# Altium footprint library ACTION标准库.pcblib: 504 footprints (part 21 of 32)
Each footprint in its own frame and in the unit in brackets; x right, y up, seen from the top. Pads: shape width x height; smd on the part's side, far side on the other; paste and mask are expansions set on the pad; w line width, h text height; cw(c..) or ccw(c..) is an arc to the next point about the centre after c.
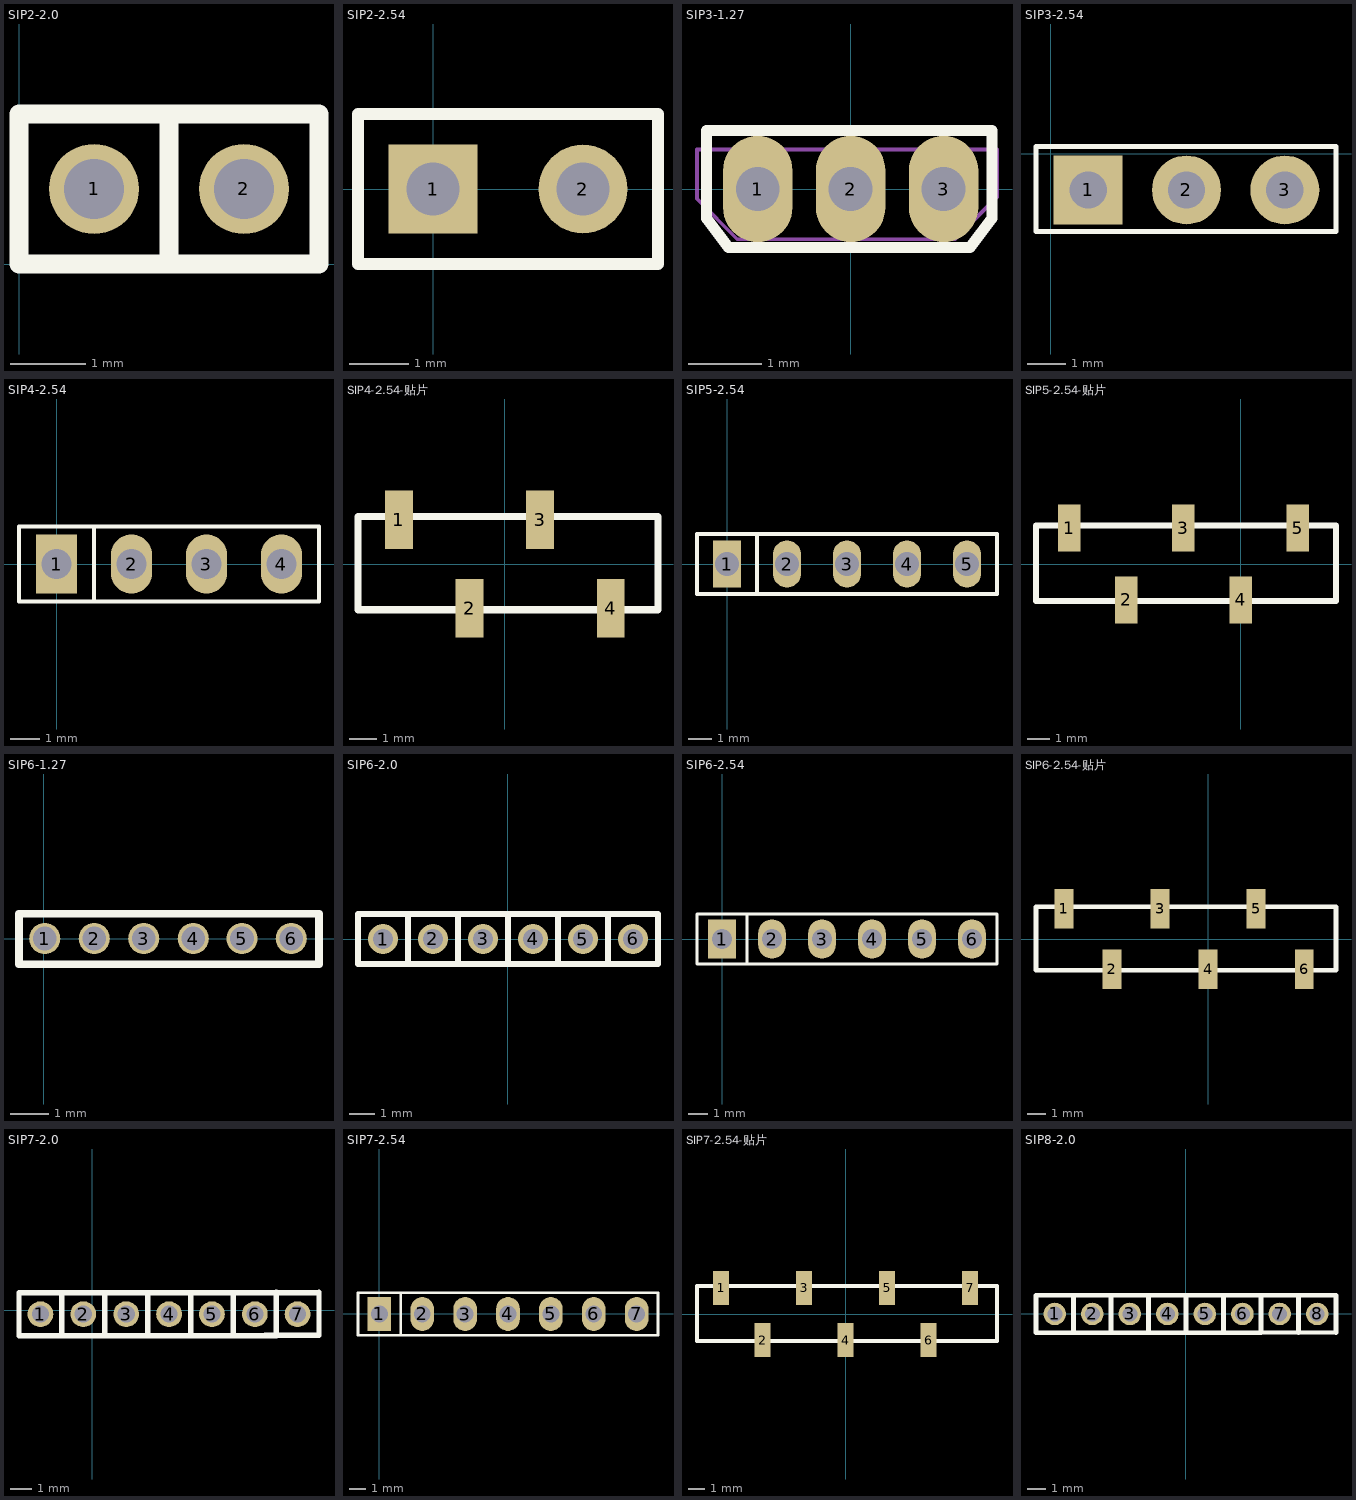
[diagram p20: the footprints below, top view; thin cyan lines are the x and y axes]

## SIP2-2.0 [mm]
pads (2):
  round 1.2 hole 0.8: 1(1,1) 2(3,1)
Top Overlay:
  lines w0.254: 2,0 2,2 ; 0,0 0,2 4,2 4,0 0,0

## SIP2-2.54 [mm] "Connector; Header; 2 Position"
height 0.6
pads (2):
  rect 1.5x1.5 hole 0.9: 1(0,0)
  round 1.5 hole 0.9: 2(2.54,0)
Top Overlay:
  lines w0.2: -1.27,-1.27 -1.27,1.27 3.81,1.27 3.81,-1.27 -1.27,-1.27
3D body "HEADER 2.STEP": height 10.1, standoff -1.5, extent -1.321,-1.27 3.759,1.27

## SIP3-1.27 [mm] "SIP; 3 Leads; Body 3 x 4 x 1.5 mm (typ); Pitch 1.27 mm"
height 15.62
pads (3):
  oval 0.95x1.45 hole 0.6: 1(-1.27,0) 2(0,0) 3(1.27,0)
Top Overlay:
  lines w0.15: -1.97,-0.4 -1.97,0.8 1.93,0.8 1.93,-0.4 1.63,-0.8 -1.67,-0.8 -1.97,-0.4
Mechanical 1:
  lines w0.05: -2.1,-0.135 -2.1,0.54 2,0.54 2,-0.11 1.425,-0.685 -1.55,-0.685 -2.1,-0.135
3D body: height 12.6, standoff -1.6, extent 1.05,-0.26 1.4,0.14
3D body: height 12.6, standoff -1.6, extent -0.2,-0.26 0.15,0.14
3D body: height 12.6, standoff -1.6, extent -1.475,-0.26 -1.125,0.14
3D body: height 15.62, standoff 12.6, extent -2.1,-0.685 2,0.54

## SIP3-2.54 [mil]
pads (3):
  rect 70x70 hole 38: 1(38,-37)
  round 70 hole 38: 2(138,-37) 3(238,-37)
Top Overlay:
  lines w5: -15,-79 290,-79 290,7 -15,7 -15,-79
3D body "排针.STEP": height 334.65, standoff -118.11, extent 188.98,-86.61 287.4,11.81
3D body "排针.STEP": height 334.65, standoff -118.11, extent 90.55,-86.61 188.98,11.81
3D body "排针.STEP": height 334.65, standoff -118.11, extent -7.87,-84.65 90.55,13.78

## SIP4-2.54 [mm]
pads (4):
  rect 1.4x2 hole 1: 1(0,0)
  oval 1.4x2 hole 1: 2(2.54,0) 3(5.08,0) 4(7.62,0)
Top Overlay:
  lines w0.15: 1.27,-1.27 1.27,1.27 ; -1.27,-1.27 8.89,-1.27 8.89,1.27 -1.27,1.27 -1.27,-1.27
3D body "Samtec-4.step": height 8.89, standoff 0, extent -1.27,-1.27 8.89,1.27

## SIP4-2.54-贴片 [mm]
pads (4):
  rect 1x2.1 smd: 1(-3.81,1.595) 2(-1.27,-1.595) 3(1.27,1.595) 4(3.81,-1.595)
Top Overlay:
  lines w0.254: -5.283,-1.646 -5.283,1.707 5.512,1.707 5.512,-1.646 -5.283,-1.646

## SIP5-2.54 [mm]
pads (5):
  rect 1.2x2 hole 1: 1(0,0)
  oval 1.2x2 hole 1: 2(2.54,0) 3(5.08,0) 4(7.62,0) 5(10.16,0)
Top Overlay:
  lines w0.15: 1.27,-1.27 1.27,1.27 ; -1.27,-1.27 11.43,-1.27 11.43,1.27 -1.27,1.27 -1.27,-1.27
3D body "Samtec-5.step": height 8.89, standoff -2.03, extent -1.27,-1.27 11.43,1.27

## SIP5-2.54-贴片 [mm]
pads (5):
  rect 1x2.1 smd: 1(-7.62,1.595) 2(-5.08,-1.595) 3(-2.54,1.595) 4(0,-1.595) 5(2.54,1.595)
Top Overlay:
  lines w0.254: -9.093,-1.646 -9.093,1.707 4.242,1.707 4.242,-1.646 -9.093,-1.646

## SIP6-1.27 [mm]
pads (6):
  round 0.8 hole 0.61: 1(0.025,0) 2(1.295,0) 3(2.565,0) 4(3.835,0) 5(5.085,0) 6(6.35,0)
Top Overlay:
  lines w0.198: -0.635,0.635 -0.635,-0.66 5.893,-0.66 ; -0.61,0.635 7.061,0.635 7.061,-0.66 5.867,-0.66

## SIP6-2.0 [mm]
pads (6):
  round 1.2 hole 0.8: 1(-4.981,0.006) 2(-2.981,0.006) 3(-0.981,0.006) 4(1.019,0.006) 5(3.019,0.006) 6(5.019,0.006)
Top Overlay:
  lines w0.254: -3.981,-0.994 -3.981,1.006 ; -1.981,-0.994 -1.981,1.006 ; 0.019,-0.994 0.019,1.006 ; 2.019,-0.994 2.019,1.006 ; 4.019,-0.994 4.019,1.006 ; -5.981,-0.994 -5.981,1.006 6.019,1.006 6.019,-0.994 -5.981,-0.994

## SIP6-2.54 [mm]
pads (6):
  rect 1.4x2 hole 1: 1(0,0)
  oval 1.4x2 hole 1: 2(2.54,0) 3(5.08,0) 4(7.62,0) 5(10.16,0) 6(12.7,0)
Top Overlay:
  lines w0.15: 1.27,-1.27 1.27,1.27 ; -1.27,-1.27 -1.27,1.27 13.97,1.27 13.97,-1.27 -1.27,-1.27
3D body "Samtec-6.step": height 8.89, standoff -2.03, extent -1.27,-1.27 13.97,1.27

## SIP6-2.54-贴片 [mm]
pads (6):
  rect 1x2.1 smd: 1(-7.62,1.595) 2(-5.08,-1.595) 3(-2.54,1.595) 4(0,-1.595) 5(2.54,1.595) 6(5.08,-1.595)
Top Overlay:
  lines w0.254: -9.093,-1.646 6.756,-1.646 6.756,1.707 -9.093,1.707 -9.093,-1.646

## SIP7-2.0 [mm]
pads (7):
  round 1.2 hole 0.8: 1(-2.415,-0.187) 2(-0.415,-0.187) 3(1.585,-0.187) 4(3.585,-0.187) 5(5.585,-0.187) 6(7.585,-0.187) 7(9.577,-0.187)
Top Overlay:
  lines w0.254: -1.415,-1.187 -1.415,0.813 ; 0.585,-1.187 0.585,0.813 ; 2.585,-1.187 2.585,0.813 ; 4.585,-1.187 4.585,0.813 ; 6.585,-1.187 6.585,0.813 ; 8.077,-1.168 10.566,-1.168 ; 8.28,0.813 10.566,0.813 ; 8.577,-1.172 8.577,0.828 ; 10.577,-1.172 10.577,0.828 ; -3.415,-1.187 -3.415,0.813 8.585,0.813 8.585,-1.187 -3.415,-1.187
3D body "User Library-PBS2-7.STEP": height 4.32, standoff -3.13, extent -3.387,-1.203 10.613,0.797

## SIP7-2.54 [mm]
pads (7):
  rect 1.4x2 hole 1: 1(0,0)
  oval 1.4x2 hole 1: 2(2.54,0) 3(5.08,0) 4(7.62,0) 5(10.16,0) 6(12.7,0) 7(15.24,0)
Top Overlay:
  lines w0.15: 1.27,-1.27 1.27,1.27 ; -1.27,-1.27 16.51,-1.27 16.51,1.27 -1.27,1.27 -1.27,-1.27
3D body "Samtec-7.step": height 8.89, standoff -2.03, extent -1.27,-1.27 16.51,1.27

## SIP7-2.54-贴片 [mm]
pads (7):
  rect 1x2.1 smd: 1(-7.62,1.595) 2(-5.08,-1.595) 3(-2.54,1.595) 4(0,-1.595) 5(2.54,1.595) 6(5.08,-1.595) 7(7.62,1.595)
Top Overlay:
  lines w0.254: -9.093,-1.646 -9.093,1.707 9.271,1.707 9.271,-1.646 -9.093,-1.646

## SIP8-2.0 [mm]
pads (8):
  round 1.2 hole 0.8: 1(-6.995,0) 2(-4.995,0) 3(-2.995,0) 4(-0.995,0) 5(1.005,0) 6(3.005,0) 7(4.995,0) 8(6.995,0)
Top Overlay:
  lines w0.254: -5.995,-1 -5.995,1 ; -3.995,-1 -3.995,1 ; -1.995,-1 -1.995,1 ; 0.005,-1 0.005,1 ; 2.005,-1 2.005,1 ; 3.177,1 7.958,1 ; 3.609,-1.002 7.958,-0.981 ; 3.995,-1.005 3.995,0.995 ; 5.995,-1.005 5.995,0.995 ; 7.995,-1.005 7.995,0.995 ; -7.995,-1 4.005,-1 4.005,1 -7.995,1 -7.995,-1
3D body "User Library-PBS2-8.STEP": height 4.32, standoff -3.13, extent -7.967,-0.975 8.033,1.025